# Altium footprint library myfirstproject_library.PcbLib: 36 footprints (part 2 of 3)
Each footprint in its own frame and in the unit in brackets; x right, y up, seen from the top. Pads: shape width x height; smd on the part's side, far side on the other; paste and mask are expansions set on the pad; w line width, h text height; cw(c..) or ccw(c..) is an arc to the next point about the centre after c.
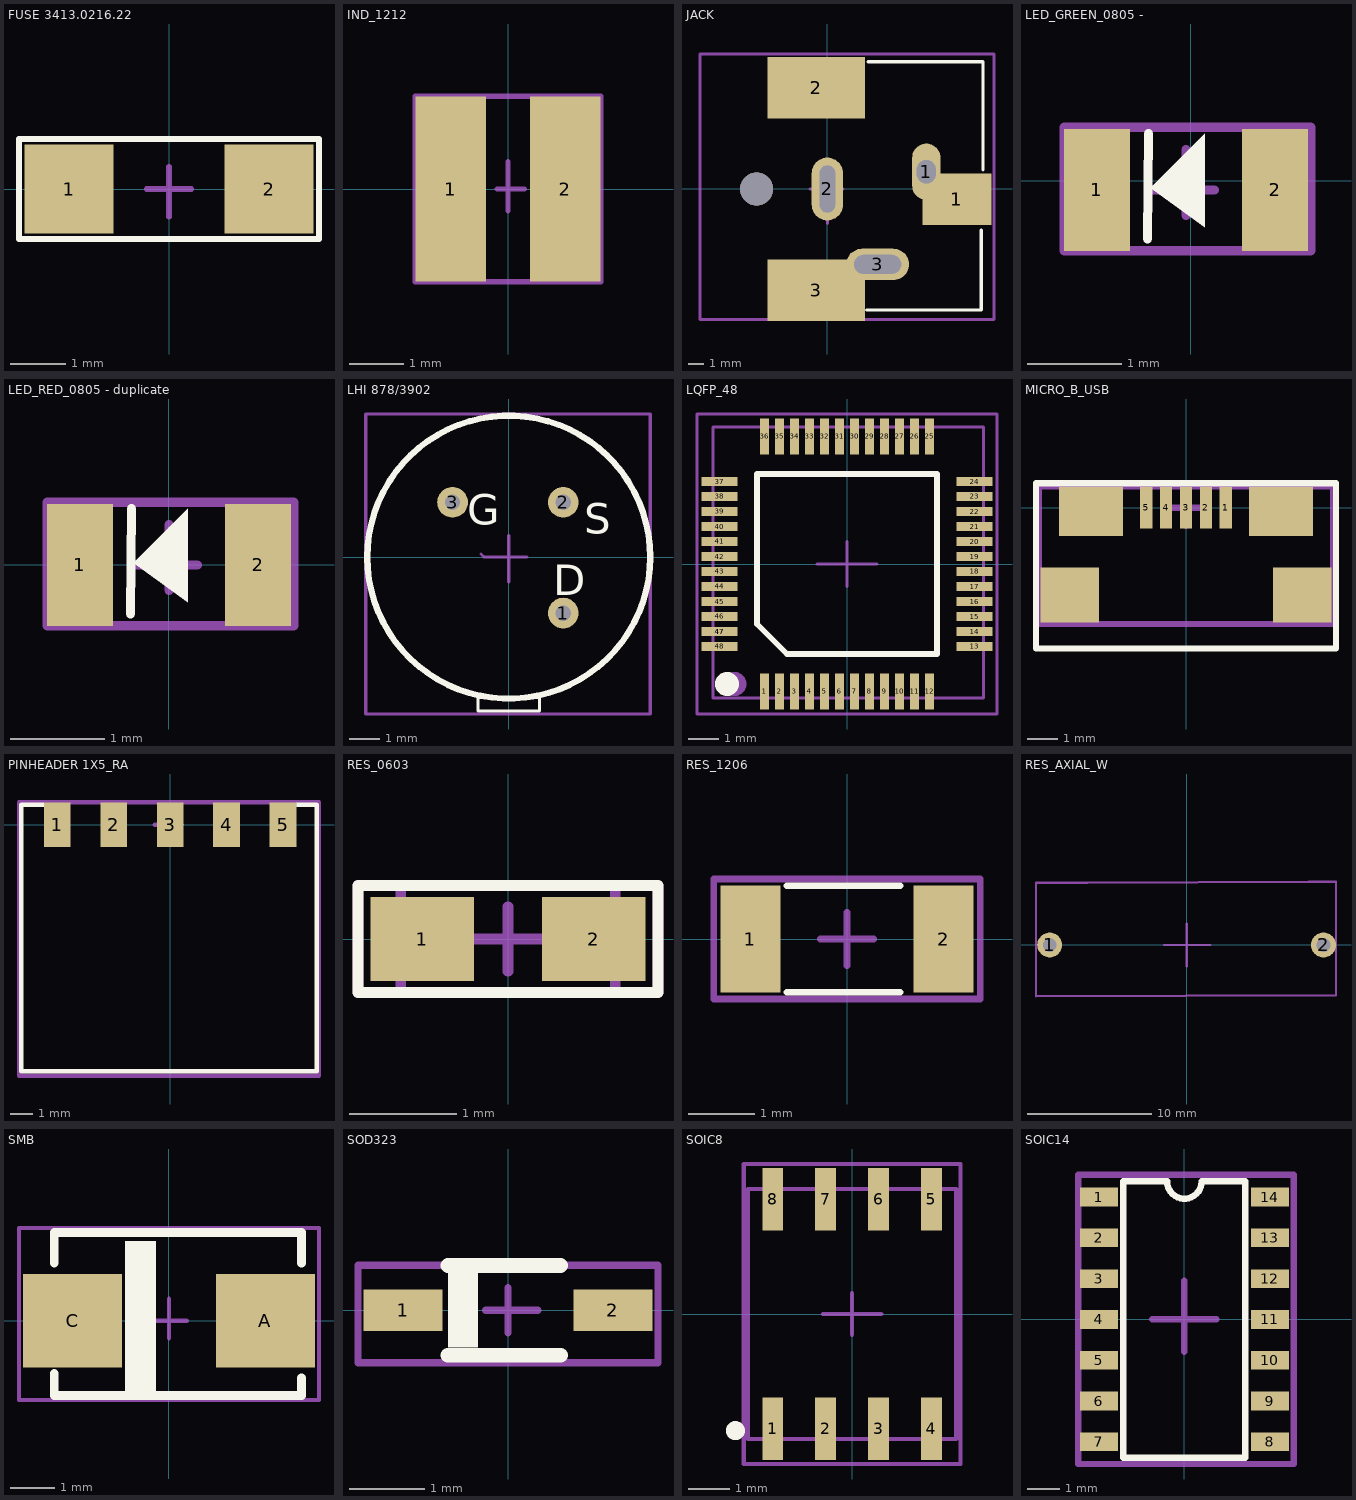
[diagram p1: the footprints below, top view; thin cyan lines are the x and y axes]

## FUSE 3413.0216.22 [mm]
pads (2):
  rect 1.6x1.6 smd mask+0.05: 1(-1.8,0) 2(1.8,0)
Top Overlay:
  lines w0.1: -2.7,-0.9 2.7,-0.9 2.7,0.9 -2.7,0.9 -2.7,-0.9
Top Component Center:
  lines w0.1: -0.4,0 0.4,0 0,0 ; 0,0 0,0.4 0,-0.5 0,0 ; -2.7,-0.9 2.7,-0.9 2.7,0.9 -2.4,0.9 -2.7,0.9 -2.7,-0.9
Top Designator:
  lines w0.1: -2.7,-0.9 -2.7,0.9 -2.4,0.9 2.7,0.9 2.7,-0.9 -2.7,-0.9
  text ".Designator" at -0.8,-0.333 h0.8
3D body "Fuse.step": height 0.64, standoff 0, extent -1.524,-0.8 1.7,0.8

## IND_1212 [mm]
pads (2):
  rect 1.3x3.4 smd mask+0.05: 1(-1.05,0) 2(1.05,0)
Top Component Center:
  lines w0.1: -0.2,0 0.3,0 0,0 ; 0,0 0,-0.4 0,0.5 0,0 ; -1.7,-1.7 -1.7,1.7 1.7,1.7 1.7,-1.7 -1.7,-1.7
Top Designator:
  lines w0.1: -1.7,-1.7 1.7,-1.7 1.7,1.7 -1.7,1.7 -1.7,-1.7
  text ".Designator" at -0.846,0.321 h0.8
3D body "IND.stp": height 1.2, standoff 0, extent -1.5,-1.5 1.5,1.5

## JACK [mm]
pads (7):
  oval 1.8x3.6 hole 1.2 slot 1.5 at 90 deg: 1(6.3,1.1)
  rect 4.4x3.3 smd: 1(8.25,-0.65)
  rect 6.2x3.9 smd: 2(-0.7,6.45) 3(-0.7,-6.45)
  oval 2x4 hole 1 slot 3 at 90 deg: 2(0,0)
  oval 4x2 hole 1.2 slot 3 at 0 deg: 3(3.2,-4.8)
  round 2.1 hole 2.1 unplated: ""(-4.5,0)
Top Overlay:
  lines w0.2: 2.5,-7.7 9.8,-7.7 9.8,-2.6 ; 2.6,8.1 9.9,8.1 9.9,1.2
Top Component Center:
  lines w0.2: -1.1,0 0,0 ; 0,-2.2 0,0 ; 0,1.1 0,0 ; 1,0 0,0 ; -8.1,-8.3 10.6,-8.3 10.6,8.6 10.1,8.6 -7.6,8.6 -8.1,8.6 -8.1,-8.3
Top Designator:
  lines w0.2: -8.1,-8.3 -8.1,8.6 -7.6,8.6 10.1,8.6 10.6,8.6 10.6,-8.3 -8.1,-8.3
  text ".Designator" at -0.046,1.687 h1
3D body "CUI_DEVICES_PJ-037AH-SMT-TR.step": height 11.2, standoff -3.2, extent -7.5,-7.5 9.6,7.7

## LED_GREEN_0805 - [mm]
pads (2):
  rect 0.7x1.3 smd mask+0.05: 1(-1,-0.1) 2(0.9,-0.1)
Top Overlay:
  region: -0.455,-0.06 -0.41,-0.06 0.15,0.5 0.15,-0.5
  lines w0.1: -0.46,-0.62 -0.45,0.5
Top Component Center:
  lines w0.1: -1.35,-0.75 1.28,-0.75 1.28,0.57 -1.35,0.57 -1.35,-0.73 ; -0.41,-0.1 0.25,-0.1 -0.05,-0.1 ; -0.05,-0.1 -0.05,0.33 -0.05,-0.37 -0.05,-0.1
Top Designator:
  lines w0.1: -1.35,-0.75 1.28,-0.75 1.28,0.57 -1.35,0.57 -1.35,-0.73
  text ".Designator" at -0.75,-0.333 h0.5
3D body "SMD_0805LED_GREEN.STEP": height 1.1, standoff 0, extent -1.079,-0.713 0.941,0.537

## LED_RED_0805 - duplicate [mm]
pads (2):
  rect 0.7x1.3 smd mask+0.05: 1(-0.95,0) 2(0.95,0)
Top Overlay:
  region: -0.405,0.04 -0.36,0.04 0.2,0.6 0.2,-0.4
  lines w0.1: -0.41,-0.52 -0.4,0.6
Top Component Center:
  lines w0.1: -1.3,-0.65 1.33,-0.65 1.33,0.67 -1.3,0.67 -1.3,-0.63 ; -0.36,0 0.3,0 0,0 ; 0,0 0,0.43 0,-0.27 0,0
Top Designator:
  lines w0.1: -1.3,-0.65 1.33,-0.65 1.33,0.67 -1.3,0.67 -1.3,-0.63
  text ".Designator" at -0.7,-0.233 h0.5
3D body "SMD_0805LED_RED.STEP": height 1.1, standoff 0, extent -1.01,-0.625 1.01,0.625

## LHI 878/3902 [mm]
pads (3):
  round 1 hole 0.5 mask+0.05: 1(1.771,-1.818) 2(1.771,1.782) 3(-1.829,1.782)
Top Overlay:
  circle w0.2: c0,0 r4.6
  lines w0.1: -1,-4.6 -1,-5 1,-5 1,-4.6
  text "D" at 1.455,-1.245 h1
  text "S" at 2.455,0.755 h1
  text "G" at -1.345,1.055 h1
Top Component Center:
  lines w0.1: -4.649,4.655 -4.649,-5.1 4.6,-5.1 4.6,4.655 -4.6,4.655 ; -0.9,0.1 -0.8,0 0.6,0 ; 0,-0.8 0,0.7
Top Designator:
  lines w0.1: -4.649,4.655 -4.649,-5.1 4.6,-5.1 4.6,4.655 -4.6,4.655
  text ".Designator" at -1.246,0.387 h1
3D body "LHI878.step": height 4.6, standoff -2.4, extent -4.6,-5.029 4.6,4.6

## LQFP_48 [mm] "7mm x7mm"
pads (49):
  rect 0.3x1.2 smd mask+0.05: 1(-2.75,-4.25) 2(-2.25,-4.25) 3(-1.75,-4.25) 4(-1.25,-4.25) 5(-0.75,-4.25) 6(-0.25,-4.25) 7(0.25,-4.25) 8(0.75,-4.25) 9(1.25,-4.25) 10(1.75,-4.25) 11(2.25,-4.25) 12(2.75,-4.25) 25(2.75,4.25) 26(2.25,4.25) 27(1.75,4.25) 28(1.25,4.25) 29(0.75,4.25) 30(0.25,4.25) 31(-0.25,4.25) 32(-0.75,4.25) 33(-1.25,4.25) 34(-1.75,4.25) 35(-2.25,4.25) 36(-2.75,4.25)
  rect 1.2x0.3 smd mask+0.05: 13(4.25,-2.75) 14(4.25,-2.25) 15(4.25,-1.75) 16(4.25,-1.25) 17(4.25,-0.75) 18(4.25,-0.25) 19(4.25,0.25) 20(4.25,0.75) 21(4.25,1.25) 22(4.25,1.75) 23(4.25,2.25) 24(4.25,2.75) 37(-4.25,2.75) 38(-4.25,2.25) 39(-4.25,1.75) 40(-4.25,1.25) 41(-4.25,0.75) 42(-4.25,0.25) 43(-4.25,-0.25) 44(-4.25,-0.75) 45(-4.25,-1.25) 46(-4.25,-1.75) 47(-4.25,-2.25) 47(-4.25,-2.25) 48(-4.25,-2.75)
Top Overlay:
  circle w0.4: c-4,-4 r0.2
  lines w0.2: -3,-2 -3,3 3,3 3,-3 -2,-3 -3,-2
Top 3D Body:
  circle w0.4: c-3.75,-4 r0.2
  lines w0.1: 4.553,4.569 -4.462,4.569 -4.462,-4.463 4.553,-4.463 4.556,-4.463 4.556,4.559
Top Component Center:
  lines w0.1: -1,0 0.75,0 1,0 ; 0,-0.75 0,-0.5 0,0.75 ; -5,-5 -5,5 5,5 5,-5 -5,-5
Top Designator:
  text ".Designator" at -1.618,-0.008 h1.52
3D body "STM32-LQFP48.SLDPRT": height 1.5, standoff 0, extent -4.45,-4.45 4.55,4.55

## MICRO_B_USB [mm]
pads (9):
  rect 0.4x1.35 smd mask+0.05: 1(1.3,0) 2(0.65,0) 3(0,0) 4(-0.65,0) 5(-1.3,0)
  rect 1.9x1.8 smd mask+0.05: ""(-3.8,-2.85) ""(3.8,-2.85)
  rect 2.1x1.6 smd mask+0.05: ""(-3.1,-0.125) ""(3.1,-0.125)
Top Overlay:
  lines w0.2: -4.9,-4.6 -4.9,-2.8 -4.9,0.8 4.9,0.8 4.9,-4.6 -4.9,-4.6
Top Component Center:
  lines w0.2: -0.7,0 0.7,0 0,0 ; 0,0 0,-0.6 0,0.5 0,0 ; -4.8,-3.8 -4.8,-2.5 -4.8,0.7 4.8,0.7 4.8,-3.8 -4.8,-3.8
Top Designator:
  lines w0.2: -4.8,-3.8 4.8,-3.8 4.8,0.7 -4.8,0.7 -4.8,-2.5 -4.8,-3.8
  text ".Designator" at -0.646,-1.579 h0.8
3D body "10118192C.stp": height 2.76, standoff -0.28, extent -3.962,-5.4 3.961,0.261

## PINHEADER 1X5_RA [mm]
pads (5):
  rect 1.2x2 smd mask+0.05: 1(-5.08,0) 2(-2.54,0) 3(0,0) 4(2.54,0) 5(5.08,0)
Top Overlay:
  lines w0.2: -5.7,0.9 -6.7,0.9 -6.7,-11.1 6.6,-11.1 6.6,0.9 5.7,0.9
Top Component Center:
  lines w0.2: -0.7,0 0.5,0 0,0 ; 0,0 0,0.5 0,-0.6 0,0 ; -6.8,-11.3 -6.8,1 -6.7,1 6.7,1 6.7,-11.3 -6.8,-11.3
Top Designator:
  lines w0.2: -6.8,-11.3 6.7,-11.3 6.7,1 -6.7,1 -6.8,1 -6.8,-11.3
  text ".Designator" at -1.546,-3.98 h2
3D body "SMH-105-02-L-S.stp": height 2.41, standoff -0.01, extent -6.604,-11.049 6.604,0.889

## RES_0603 [mil]
pads (2):
  rect 38x31 smd mask+1.97: 1(-31.5,0) 2(31.5,0)
Top Overlay:
  lines w3.94: -55.12,-19.68 55.12,-19.68 55.12,19.68 -55.12,19.68 -55.12,-19.68
Top 3D Body:
  lines w3.94: -39.37,-19.68 39.37,-19.68 39.37,19.68 -39.37,19.68 -39.37,-19.68
Top Component Center:
  lines w3.94: -11.81,0 11.81,0 ; 0,-11.81 0,11.81 ; -55.12,-19.68 55.12,-19.68 55.12,19.68 -55.12,19.68 -55.12,-19.68
Top Designator:
  lines w3.94: -55.12,-19.68 55.12,-19.68 55.12,19.68 -55.12,19.68 -55.12,-19.68
  text ".Designator" at -11.81,-7.88 h23.62
3D body "0603S1.STEP": height 16.89, standoff -0.83, extent -38.92,-19.68 38.92,18.88

## RES_1206 [mm]
pads (2):
  rect 0.9x1.6 smd mask+0.05: 1(-1.45,0) 2(1.45,0)
Top Overlay:
  lines w0.1: -0.9,-0.8 0.8,-0.8 ; -0.9,0.8 0.8,0.8
Top Component Center:
  lines w0.1: -0.4,0 0.4,0 0,0 ; 0,0 0,0.4 0,-0.4 0,0 ; -2,-0.9 2,-0.9 2,0.9 -2,0.9 -2,-0.9
Top Designator:
  lines w0.1: -2,-0.9 -2,0.9 2,0.9 2,-0.9 -2,-0.9
  text "'.Designator" at -0.146,-0.079 h0.8
3D body "res1206r.STEP": height 0.55, standoff 0, extent -1.984,-0.938 1.984,0.938

## RES_AXIAL_W [mm]
pads (2):
  round 2 hole 1.1 mask+0.05: 1(-11,0) 2(11,0)
Top Component Center:
  lines w0.2: -1.8,0 1.9,0 0,0 ; 0,0 0,1.7 0,-1.7 0,0 ; -12.1,-4.137 12,-4.037 12,5.1 9.8,5.1 -8,5 -12.1,5 -12.1,-4.137
Top Designator:
  lines w0.2: -12.1,-4.137 12,-4.037 12,5.1 9.8,5.1 -8,5 -12.1,5 -12.1,-4.137
  text ".Designator" at -1.846,1.02 h2
3D body: height 5, standoff 0, extent -8,-4 8,5
3D body: height 2.85, standoff -2.5, extent -11.397,-0.399 -10.6,0.399
3D body: height 2.9, standoff 2.1, extent -11.3,-0.4 -7.3,0.398
3D body: height 2.85, standoff -2.5, extent 10.6,-0.399 11.397,0.399
3D body: height 2.9, standoff 2.1, extent 7.3,-0.398 11.3,0.4

## SMB [mm]
pads (2):
  rect 2.25x2.12 smd mask+0.05: A(2.185,0) C(-2.185,0)
Top Overlay:
  rectangle: -1,-1.6 -0.3,1.8
  lines w0.2: -2.6,-1.2 -2.6,-1.7 3,-1.7 3,-1.3 ; -2.6,1.3 -2.6,2 3,2 3,1.3
Top Component Center:
  lines w0.1: -0.3,0 0.4,0 0,0 ; 0,0 0,0.5 0,-0.4 0,0 ; -3.4,-1.8 3.4,-1.8 3.4,2.1 -3.4,2.1 -3.4,-1.8
Top Designator:
  lines w0.1: -3.4,-1.8 3.4,-1.8 3.4,2.1 -3.4,2.1 -3.4,-1.8
  text ".Designator" at -0.846,0.221 h0.8
3D body "SMB.STEP": height 2.44, standoff -0.03, extent -2.52,-1.66 2.92,1.9

## SOD323 [mm]
pads (2):
  rect 1.05x0.55 smd mask+0.05: 1(-1.4,0) 2(1.4,0)
Top Overlay:
  rectangle: -0.8,-0.5 -0.4,0.5
  lines w0.2: -0.8,-0.6 0.7,-0.6 ; -0.8,0.6 0.7,0.6
Top Component Center:
  lines w0.1: -1.1,0.6 2,0.6 2,-0.7 -2,-0.7 -2,0.6 -0.9,0.6 ; -0.3,0 0.4,0 0,0 ; 0,0 0,0.3 0,-0.3 0,0
Top Designator:
  lines w0.1: -1.1,0.6 2,0.6 2,-0.7 -2,-0.7 -2,0.6 -0.9,0.6
  text ".Designator" at -0.646,-0.279 h0.8
3D body "1N4148WS.STEP": height 1.1, standoff 0, extent -1.25,-0.625 1.25,0.625

## SOIC8 [mm]
pads (8):
  rect 0.5x1.5 smd mask+0.05: 1(-1.905,-2.75) 2(-0.635,-2.75) 3(0.635,-2.75) 4(1.905,-2.75) 5(1.905,2.75) 6(0.635,2.75) 7(-0.635,2.75) 8(-1.905,2.75)
Top Overlay:
  circle w0.254: c-2.8,-2.8 r0.1
Top 3D Body:
  circle w0.254: c-1.9,-2.5 r0.1
  lines w0.1: -2.5,-3 2.5,-3 2.5,3 -2.5,3 -2.5,-3
Top Component Center:
  lines w0.1: -0.7,0 0.7,0 ; 0,-0.5 0,-0.2 0,0.5
Top Designator:
  lines w0.1: -2.6,-3.6 -2.6,3.6 -2.5,3.6 2.6,3.6 2.6,-3.6 -2.6,-3.6
  text ".Designator" at -0.846,0.262 h1.52
3D body "SOIC-8.step": height 1.75, standoff 0, extent -2.45,-3 2.45,3

## SOIC14 [mm]
pads (14):
  rect 1.18x0.58 smd mask+0.05: 1(-2.66,3.81) 2(-2.66,2.54) 3(-2.66,1.27) 4(-2.66,0) 5(-2.66,-1.27) 6(-2.66,-2.54) 7(-2.66,-3.81) 8(2.66,-3.81) 9(2.66,-2.54) 10(2.66,-1.27) 11(2.66,0) 12(2.66,1.27) 13(2.66,2.54) 14(2.66,3.81)
Top Overlay:
  lines w0.2: -1.9,-4.3 -1.9,4.1 -1.9,4.3 -0.539,4.3 ccw(c0,4.3) 0.539,4.3 1.9,4.3 1.9,4.1 1.9,-4.3 -1.9,-4.3
Top Component Center:
  lines w0.2: -1,0 1,0 0,0 ; 0,0 0,1.2 0,-1 0,0 ; -3.3,-4.5 -3.3,4.5 3.4,4.5 3.4,-4.5 -3.3,-4.5
Top Designator:
  lines w0.2: -3.3,-4.5 3.4,-4.5 3.4,4.5 -3.3,4.5 -3.3,-4.5
  text ".Designator" at -0.8,0.6 h0.6
3D body "CircuitWorks-SO-14.step": height 1.75, standoff 0, extent -2.996,-4.318 3.1,4.318